# Altium integrated library 860010580021_Altium_WCAP-ATG8_rev20a.IntLib: 195 symbols (part 2 of 2)
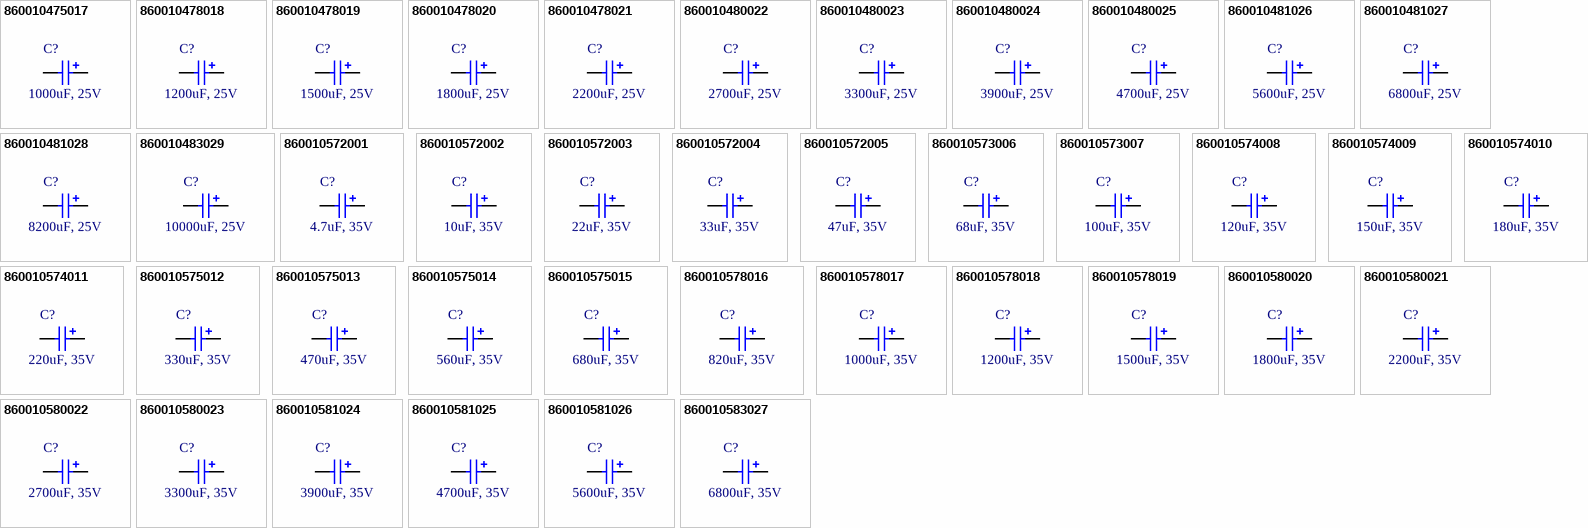
[diagram p5: symbols 860010475017 to 860010583027]

## 860010580022
designator C?, comment 2700uF, 35V
WCAP-ATG8 Aluminum Electrolytic Capacitor, Radial, THT, D16xH31.5mm, 2700uF, 35V; Manufacturer Part Number: 860010580022; Manufacturer: Wurth Elektronik; Dissipation Factor: 12%; Endurance: 2000h; Leakage Current: 945uA; Ripple Current: 2178mA; Capacitance Tolerance: +/-20%; Rated Voltage: 35VDC; Technical Reference: ATBK315272M035DSPADB000; ComponentLink1Description: Manufacturer; ComponentLink1URL: http://www.we-online.de; ComponentLink2Description: Datasheet; ComponentLink2URL: https://www.we-online.com/catalog/datasheet/860010580022.pdf; Height: 31.5mm; Mounting Technology: THT; Operating Temperature: -40 to +85degC; Packaging: Ammo Pack; Published Date: May 2020; Capacitance: 2700uF; Diameter: 16mm
footprint WCAP-ATG8_16x31.5
pins: 1 N, 2 P

## 860010580023
designator C?, comment 3300uF, 35V
WCAP-ATG8 Aluminum Electrolytic Capacitor, Radial, THT, D16xH31.5mm, 3300uF, 35V; Manufacturer Part Number: 860010580023; Manufacturer: Wurth Elektronik; Dissipation Factor: 12%; Endurance: 2000h; Leakage Current: 1155uA; Ripple Current: 2365mA; Capacitance Tolerance: +/-20%; Rated Voltage: 35VDC; Technical Reference: ATBK315332M035DSPADB000; ComponentLink1Description: Manufacturer; ComponentLink1URL: http://www.we-online.de; ComponentLink2Description: Datasheet; ComponentLink2URL: https://www.we-online.com/catalog/datasheet/860010580023.pdf; Height: 31.5mm; Mounting Technology: THT; Operating Temperature: -40 to +85degC; Packaging: Ammo Pack; Published Date: May 2020; Capacitance: 3300uF; Diameter: 16mm
footprint WCAP-ATG8_16x31.5
pins: 1 N, 2 P

## 860010581024
designator C?, comment 3900uF, 35V
WCAP-ATG8 Aluminum Electrolytic Capacitor, Radial, THT, D18xH31.5mm, 3900uF, 35V; Manufacturer Part Number: 860010581024; Manufacturer: Wurth Elektronik; Dissipation Factor: 12%; Endurance: 2000h; Leakage Current: 1365uA; Ripple Current: 2640mA; Capacitance Tolerance: +/-20%; Rated Voltage: 35VDC; Technical Reference: ATBL315392M035DSPAEB000; ComponentLink1Description: Manufacturer; ComponentLink1URL: http://www.we-online.de; ComponentLink2Description: Datasheet; ComponentLink2URL: https://www.we-online.com/catalog/datasheet/860010581024.pdf; Height: 31.5mm; Mounting Technology: THT; Operating Temperature: -40 to +85degC; Packaging: Ammo Pack; Published Date: May 2020; Capacitance: 3900uF; Diameter: 18mm
footprint WCAP-ATG8_18x31.5
pins: 1 N, 2 P

## 860010581025
designator C?, comment 4700uF, 35V
WCAP-ATG8 Aluminum Electrolytic Capacitor, Radial, THT, D18xH35.5mm, 4700uF, 35V; Manufacturer Part Number: 860010581025; Manufacturer: Wurth Elektronik; Dissipation Factor: 12%; Endurance: 2000h; Leakage Current: 1645uA; Ripple Current: 2860mA; Capacitance Tolerance: +/-20%; Rated Voltage: 35VDC; Technical Reference: ATBL355472M035DSPAEB000; ComponentLink1Description: Manufacturer; ComponentLink1URL: http://www.we-online.de; ComponentLink2Description: Datasheet; ComponentLink2URL: https://www.we-online.com/catalog/datasheet/860010581025.pdf; Height: 35.5mm; Mounting Technology: THT; Operating Temperature: -40 to +85degC; Packaging: Ammo Pack; Published Date: May 2020; Capacitance: 4700uF; Diameter: 18mm
footprint WCAP-ATG8_18x35.5
pins: 1 N, 2 P

## 860010581026
designator C?, comment 5600uF, 35V
WCAP-ATG8 Aluminum Electrolytic Capacitor, Radial, THT, D18xH41mm, 5600uF, 35V; Manufacturer Part Number: 860010581026; Manufacturer: Wurth Elektronik; Dissipation Factor: 12%; Endurance: 2000h; Leakage Current: 1960uA; Ripple Current: 2915mA; Capacitance Tolerance: +/-20%; Rated Voltage: 35VDC; Technical Reference: ATBL410562M035DSPS1B000; ComponentLink1Description: Manufacturer; ComponentLink1URL: http://www.we-online.de; ComponentLink2Description: Datasheet; ComponentLink2URL: https://www.we-online.com/catalog/datasheet/860010581026.pdf; Height: 41mm; Mounting Technology: THT; Operating Temperature: -40 to +85degC; Packaging: Ammo Pack; Published Date: May 2020; Capacitance: 5600uF; Diameter: 18mm
footprint WCAP-ATG8_18x41
pins: 1 N, 2 P

## 860010583027
designator C?, comment 6800uF, 35V
WCAP-ATG8 Aluminum Electrolytic Capacitor, Radial, THT, D22xH41mm, 6800uF, 35V; Manufacturer Part Number: 860010583027; Manufacturer: Wurth Elektronik; Dissipation Factor: 12%; Endurance: 2000h; Leakage Current: 2380uA; Ripple Current: 3630mA; Capacitance Tolerance: +/-20%; Rated Voltage: 35VDC; Technical Reference: ATBN410682M035DSPS2B000; ComponentLink1Description: Manufacturer; ComponentLink1URL: http://www.we-online.de; ComponentLink2Description: Datasheet; ComponentLink2URL: https://www.we-online.com/catalog/datasheet/860010583027.pdf; Height: 41mm; Mounting Technology: THT; Operating Temperature: -40 to +85degC; Packaging: Ammo Pack; Published Date: May 2020; Capacitance: 6800uF; Diameter: 22mm
footprint WCAP-ATG8_22x41
pins: 1 N, 2 P

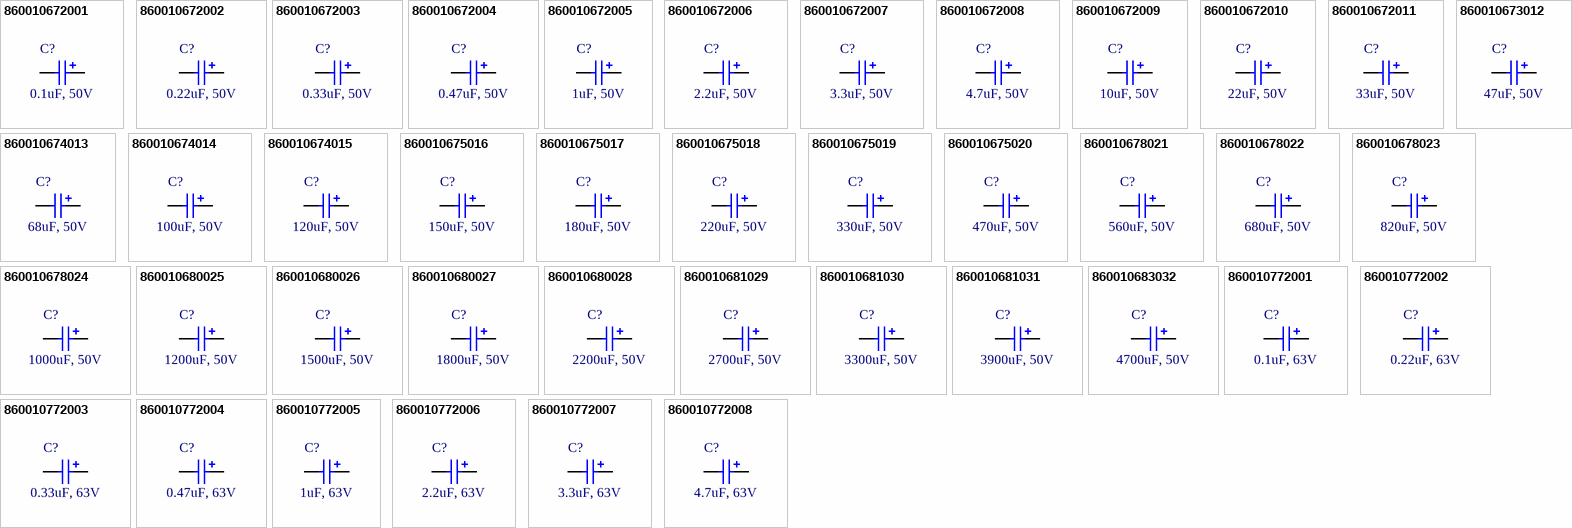
[diagram p3: symbols 860010672001 to 860010772008]

## 860010672001
designator C?, comment 0.1uF, 50V
WCAP-ATG8 Aluminum Electrolytic Capacitor, Radial, THT, D5xH11mm, 0.1uF, 50V; Manufacturer Part Number: 860010672001; Manufacturer: Wurth Elektronik; Dissipation Factor: 10%; Endurance: 2000h; Leakage Current: 3uA; Ripple Current: 3.3mA; Capacitance Tolerance: +/-20%; Rated Voltage: 50VDC; Technical Reference: ATBC110R10M050DSPA3B000; ComponentLink1Description: Manufacturer; ComponentLink1URL: http://www.we-online.de; ComponentLink2Description: Datasheet; ComponentLink2URL: https://www.we-online.com/catalog/datasheet/860010672001.pdf; Height: 11mm; Mounting Technology: THT; Operating Temperature: -40 to +85degC; Packaging: Ammo Pack; Published Date: May 2020; Capacitance: 0.1uF; Diameter: 5mm
footprint WCAP-ATG8_5x11
pins: 1 N, 2 P

## 860010672002
designator C?, comment 0.22uF, 50V
WCAP-ATG8 Aluminum Electrolytic Capacitor, Radial, THT, D5xH11mm, 0.22uF, 50V; Manufacturer Part Number: 860010672002; Manufacturer: Wurth Elektronik; Dissipation Factor: 10%; Endurance: 2000h; Leakage Current: 3uA; Ripple Current: 3.3mA; Capacitance Tolerance: +/-20%; Rated Voltage: 50VDC; Technical Reference: ATBC110R22M050DSPA3B000; ComponentLink1Description: Manufacturer; ComponentLink1URL: http://www.we-online.de; ComponentLink2Description: Datasheet; ComponentLink2URL: https://www.we-online.com/catalog/datasheet/860010672002.pdf; Height: 11mm; Mounting Technology: THT; Operating Temperature: -40 to +85degC; Packaging: Ammo Pack; Published Date: May 2020; Capacitance: 0.22uF; Diameter: 5mm
footprint WCAP-ATG8_5x11
pins: 1 N, 2 P

## 860010672003
designator C?, comment 0.33uF, 50V
WCAP-ATG8 Aluminum Electrolytic Capacitor, Radial, THT, D5xH11mm, 0.33uF, 50V; Manufacturer Part Number: 860010672003; Manufacturer: Wurth Elektronik; Dissipation Factor: 10%; Endurance: 2000h; Leakage Current: 3uA; Ripple Current: 5.5mA; Capacitance Tolerance: +/-20%; Rated Voltage: 50VDC; Technical Reference: ATBC110R33M050DSPA3B000; ComponentLink1Description: Manufacturer; ComponentLink1URL: http://www.we-online.de; ComponentLink2Description: Datasheet; ComponentLink2URL: https://www.we-online.com/catalog/datasheet/860010672003.pdf; Height: 11mm; Mounting Technology: THT; Operating Temperature: -40 to +85degC; Packaging: Ammo Pack; Published Date: May 2020; Capacitance: 0.33uF; Diameter: 5mm
footprint WCAP-ATG8_5x11
pins: 1 N, 2 P

## 860010672004
designator C?, comment 0.47uF, 50V
WCAP-ATG8 Aluminum Electrolytic Capacitor, Radial, THT, D5xH11mm, 0.47uF, 50V; Manufacturer Part Number: 860010672004; Manufacturer: Wurth Elektronik; Dissipation Factor: 10%; Endurance: 2000h; Leakage Current: 3uA; Ripple Current: 7.5mA; Capacitance Tolerance: +/-20%; Rated Voltage: 50VDC; Technical Reference: ATBC110R47M050DSPA3B000; ComponentLink1Description: Manufacturer; ComponentLink1URL: http://www.we-online.de; ComponentLink2Description: Datasheet; ComponentLink2URL: https://www.we-online.com/catalog/datasheet/860010672004.pdf; Height: 11mm; Mounting Technology: THT; Operating Temperature: -40 to +85degC; Packaging: Ammo Pack; Published Date: May 2020; Capacitance: 0.47uF; Diameter: 5mm
footprint WCAP-ATG8_5x11
pins: 1 N, 2 P

## 860010672005
designator C?, comment 1uF, 50V
WCAP-ATG8 Aluminum Electrolytic Capacitor, Radial, THT, D5xH11mm, 1uF, 50V; Manufacturer Part Number: 860010672005; Manufacturer: Wurth Elektronik; Dissipation Factor: 10%; Endurance: 2000h; Leakage Current: 3uA; Ripple Current: 17mA; Capacitance Tolerance: +/-20%; Rated Voltage: 50VDC; Technical Reference: ATBC110010M050DSPA3B000; ComponentLink1Description: Manufacturer; ComponentLink1URL: http://www.we-online.de; ComponentLink2Description: Datasheet; ComponentLink2URL: https://www.we-online.com/catalog/datasheet/860010672005.pdf; Height: 11mm; Mounting Technology: THT; Operating Temperature: -40 to +85degC; Packaging: Ammo Pack; Published Date: May 2020; Capacitance: 1uF; Diameter: 5mm
footprint WCAP-ATG8_5x11
pins: 1 N, 2 P

## 860010672006
designator C?, comment 2.2uF, 50V
WCAP-ATG8 Aluminum Electrolytic Capacitor, Radial, THT, D5xH11mm, 2.2uF, 50V; Manufacturer Part Number: 860010672006; Manufacturer: Wurth Elektronik; Dissipation Factor: 10%; Endurance: 2000h; Leakage Current: 3uA; Ripple Current: 28mA; Capacitance Tolerance: +/-20%; Rated Voltage: 50VDC; Technical Reference: ATBC1102R2M050DSPA3B000; ComponentLink1Description: Manufacturer; ComponentLink1URL: http://www.we-online.de; ComponentLink2Description: Datasheet; ComponentLink2URL: https://www.we-online.com/catalog/datasheet/860010672006.pdf; Height: 11mm; Mounting Technology: THT; Operating Temperature: -40 to +85degC; Packaging: Ammo Pack; Published Date: May 2020; Capacitance: 2.2uF; Diameter: 5mm
footprint WCAP-ATG8_5x11
pins: 1 N, 2 P

## 860010672007
designator C?, comment 3.3uF, 50V
WCAP-ATG8 Aluminum Electrolytic Capacitor, Radial, THT, D5xH11mm, 3.3uF, 50V; Manufacturer Part Number: 860010672007; Manufacturer: Wurth Elektronik; Dissipation Factor: 10%; Endurance: 2000h; Leakage Current: 3uA; Ripple Current: 39mA; Capacitance Tolerance: +/-20%; Rated Voltage: 50VDC; Technical Reference: ATBC1103R3M050DSPA3B000; ComponentLink1Description: Manufacturer; ComponentLink1URL: http://www.we-online.de; ComponentLink2Description: Datasheet; ComponentLink2URL: https://www.we-online.com/catalog/datasheet/860010672007.pdf; Height: 11mm; Mounting Technology: THT; Operating Temperature: -40 to +85degC; Packaging: Ammo Pack; Published Date: May 2020; Capacitance: 3.3uF; Diameter: 5mm
footprint WCAP-ATG8_5x11
pins: 1 N, 2 P

## 860010672008
designator C?, comment 4.7uF, 50V
WCAP-ATG8 Aluminum Electrolytic Capacitor, Radial, THT, D5xH11mm, 4.7uF, 50V; Manufacturer Part Number: 860010672008; Manufacturer: Wurth Elektronik; Dissipation Factor: 10%; Endurance: 2000h; Leakage Current: 3uA; Ripple Current: 46mA; Capacitance Tolerance: +/-20%; Rated Voltage: 50VDC; Technical Reference: ATBC1104R7M050DSPA3B000; ComponentLink1Description: Manufacturer; ComponentLink1URL: http://www.we-online.de; ComponentLink2Description: Datasheet; ComponentLink2URL: https://www.we-online.com/catalog/datasheet/860010672008.pdf; Height: 11mm; Mounting Technology: THT; Operating Temperature: -40 to +85degC; Packaging: Ammo Pack; Published Date: May 2020; Capacitance: 4.7uF; Diameter: 5mm
footprint WCAP-ATG8_5x11
pins: 1 N, 2 P

## 860010672009
designator C?, comment 10uF, 50V
WCAP-ATG8 Aluminum Electrolytic Capacitor, Radial, THT, D5xH11mm, 10uF, 50V; Manufacturer Part Number: 860010672009; Manufacturer: Wurth Elektronik; Dissipation Factor: 10%; Endurance: 2000h; Leakage Current: 5uA; Ripple Current: 72mA; Capacitance Tolerance: +/-20%; Rated Voltage: 50VDC; Technical Reference: ATBC110100M050DSPA3B000; ComponentLink1Description: Manufacturer; ComponentLink1URL: http://www.we-online.de; ComponentLink2Description: Datasheet; ComponentLink2URL: https://www.we-online.com/catalog/datasheet/860010672009.pdf; Height: 11mm; Mounting Technology: THT; Operating Temperature: -40 to +85degC; Packaging: Ammo Pack; Published Date: May 2020; Capacitance: 10uF; Diameter: 5mm
footprint WCAP-ATG8_5x11
pins: 1 N, 2 P

## 860010672010
designator C?, comment 22uF, 50V
WCAP-ATG8 Aluminum Electrolytic Capacitor, Radial, THT, D5xH11mm, 22uF, 50V; Manufacturer Part Number: 860010672010; Manufacturer: Wurth Elektronik; Dissipation Factor: 10%; Endurance: 2000h; Leakage Current: 11uA; Ripple Current: 110mA; Capacitance Tolerance: +/-20%; Rated Voltage: 50VDC; Technical Reference: ATBC110220M050DSPA3B000; ComponentLink1Description: Manufacturer; ComponentLink1URL: http://www.we-online.de; ComponentLink2Description: Datasheet; ComponentLink2URL: https://www.we-online.com/catalog/datasheet/860010672010.pdf; Height: 11mm; Mounting Technology: THT; Operating Temperature: -40 to +85degC; Packaging: Ammo Pack; Published Date: May 2020; Capacitance: 22uF; Diameter: 5mm
footprint WCAP-ATG8_5x11
pins: 1 N, 2 P

## 860010672011
designator C?, comment 33uF, 50V
WCAP-ATG8 Aluminum Electrolytic Capacitor, Radial, THT, D5xH11mm, 33uF, 50V; Manufacturer Part Number: 860010672011; Manufacturer: Wurth Elektronik; Dissipation Factor: 10%; Endurance: 2000h; Leakage Current: 16.5uA; Ripple Current: 132mA; Capacitance Tolerance: +/-20%; Rated Voltage: 50VDC; Technical Reference: ATBC110330M050DSPA3B000; ComponentLink1Description: Manufacturer; ComponentLink1URL: http://www.we-online.de; ComponentLink2Description: Datasheet; ComponentLink2URL: https://www.we-online.com/catalog/datasheet/860010672011.pdf; Height: 11mm; Mounting Technology: THT; Operating Temperature: -40 to +85degC; Packaging: Ammo Pack; Published Date: May 2020; Capacitance: 33uF; Diameter: 5mm
footprint WCAP-ATG8_5x11
pins: 1 N, 2 P

## 860010673012
designator C?, comment 47uF, 50V
WCAP-ATG8 Aluminum Electrolytic Capacitor, Radial, THT, D6.3xH11mm, 47uF, 50V; Manufacturer Part Number: 860010673012; Manufacturer: Wurth Elektronik; Dissipation Factor: 10%; Endurance: 2000h; Leakage Current: 23.5uA; Ripple Current: 165mA; Capacitance Tolerance: +/-20%; Rated Voltage: 50VDC; Technical Reference: ATBD110470M050DSPA4B000; ComponentLink1Description: Manufacturer; ComponentLink1URL: http://www.we-online.de; ComponentLink2Description: Datasheet; ComponentLink2URL: https://www.we-online.com/catalog/datasheet/860010673012.pdf; Height: 11mm; Mounting Technology: THT; Operating Temperature: -40 to +85degC; Packaging: Ammo Pack; Published Date: May 2020; Capacitance: 47uF; Diameter: 6.3mm
footprint WCAP-ATG8_6.3x11
pins: 1 N, 2 P

## 860010674013
designator C?, comment 68uF, 50V
WCAP-ATG8 Aluminum Electrolytic Capacitor, Radial, THT, D8xH11.5mm, 68uF, 50V; Manufacturer Part Number: 860010674013; Manufacturer: Wurth Elektronik; Dissipation Factor: 10%; Endurance: 2000h; Leakage Current: 34uA; Ripple Current: 220mA; Capacitance Tolerance: +/-20%; Rated Voltage: 50VDC; Technical Reference: ATBE115680M050DSPA7B000; ComponentLink1Description: Manufacturer; ComponentLink1URL: http://www.we-online.de; ComponentLink2Description: Datasheet; ComponentLink2URL: https://www.we-online.com/catalog/datasheet/860010674013.pdf; Height: 11.5mm; Mounting Technology: THT; Operating Temperature: -40 to +85degC; Packaging: Ammo Pack; Published Date: May 2020; Capacitance: 68uF; Diameter: 8mm
footprint WCAP-ATG8_8x11.5
pins: 1 N, 2 P

## 860010674014
designator C?, comment 100uF, 50V
WCAP-ATG8 Aluminum Electrolytic Capacitor, Radial, THT, D8xH11.5mm, 100uF, 50V; Manufacturer Part Number: 860010674014; Manufacturer: Wurth Elektronik; Dissipation Factor: 10%; Endurance: 2000h; Leakage Current: 50uA; Ripple Current: 286mA; Capacitance Tolerance: +/-20%; Rated Voltage: 50VDC; Technical Reference: ATBE115101M050DSPA7B000; ComponentLink1Description: Manufacturer; ComponentLink1URL: http://www.we-online.de; ComponentLink2Description: Datasheet; ComponentLink2URL: https://www.we-online.com/catalog/datasheet/860010674014.pdf; Height: 11.5mm; Mounting Technology: THT; Operating Temperature: -40 to +85degC; Packaging: Ammo Pack; Published Date: May 2020; Capacitance: 100uF; Diameter: 8mm
footprint WCAP-ATG8_8x11.5
pins: 1 N, 2 P

## 860010674015
designator C?, comment 120uF, 50V
WCAP-ATG8 Aluminum Electrolytic Capacitor, Radial, THT, D8xH11.5mm, 120uF, 50V; Manufacturer Part Number: 860010674015; Manufacturer: Wurth Elektronik; Dissipation Factor: 10%; Endurance: 2000h; Leakage Current: 60uA; Ripple Current: 319mA; Capacitance Tolerance: +/-20%; Rated Voltage: 50VDC; Technical Reference: ATBE115121M050DSPA7B000; ComponentLink1Description: Manufacturer; ComponentLink1URL: http://www.we-online.de; ComponentLink2Description: Datasheet; ComponentLink2URL: https://www.we-online.com/catalog/datasheet/860010674015.pdf; Height: 11.5mm; Mounting Technology: THT; Operating Temperature: -40 to +85degC; Packaging: Ammo Pack; Published Date: May 2020; Capacitance: 120uF; Diameter: 8mm
footprint WCAP-ATG8_8x11.5
pins: 1 N, 2 P

## 860010675016
designator C?, comment 150uF, 50V
WCAP-ATG8 Aluminum Electrolytic Capacitor, Radial, THT, D10xH12.5mm, 150uF, 50V; Manufacturer Part Number: 860010675016; Manufacturer: Wurth Elektronik; Dissipation Factor: 10%; Endurance: 2000h; Leakage Current: 75uA; Ripple Current: 363mA; Capacitance Tolerance: +/-20%; Rated Voltage: 50VDC; Technical Reference: ATBF125151M050DSPA9B000; ComponentLink1Description: Manufacturer; ComponentLink1URL: http://www.we-online.de; ComponentLink2Description: Datasheet; ComponentLink2URL: https://www.we-online.com/catalog/datasheet/860010675016.pdf; Height: 12.5mm; Mounting Technology: THT; Operating Temperature: -40 to +85degC; Packaging: Ammo Pack; Published Date: May 2020; Capacitance: 150uF; Diameter: 10mm
footprint WCAP-ATG8_10x12.5
pins: 1 N, 2 P

## 860010675017
designator C?, comment 180uF, 50V
WCAP-ATG8 Aluminum Electrolytic Capacitor, Radial, THT, D10xH12.5mm, 180uF, 50V; Manufacturer Part Number: 860010675017; Manufacturer: Wurth Elektronik; Dissipation Factor: 10%; Endurance: 2000h; Leakage Current: 90uA; Ripple Current: 418mA; Capacitance Tolerance: +/-20%; Rated Voltage: 50VDC; Technical Reference: ATBF125181M050DSPA9B000; ComponentLink1Description: Manufacturer; ComponentLink1URL: http://www.we-online.de; ComponentLink2Description: Datasheet; ComponentLink2URL: https://www.we-online.com/catalog/datasheet/860010675017.pdf; Height: 12.5mm; Mounting Technology: THT; Operating Temperature: -40 to +85degC; Packaging: Ammo Pack; Published Date: May 2020; Capacitance: 180uF; Diameter: 10mm
footprint WCAP-ATG8_10x12.5
pins: 1 N, 2 P

## 860010675018
designator C?, comment 220uF, 50V
WCAP-ATG8 Aluminum Electrolytic Capacitor, Radial, THT, D10xH12.5mm, 220uF, 50V; Manufacturer Part Number: 860010675018; Manufacturer: Wurth Elektronik; Dissipation Factor: 10%; Endurance: 2000h; Leakage Current: 110uA; Ripple Current: 468mA; Capacitance Tolerance: +/-20%; Rated Voltage: 50VDC; Technical Reference: ATBF125221M050DSPA9B000; ComponentLink1Description: Manufacturer; ComponentLink1URL: http://www.we-online.de; ComponentLink2Description: Datasheet; ComponentLink2URL: https://www.we-online.com/catalog/datasheet/860010675018.pdf; Height: 12.5mm; Mounting Technology: THT; Operating Temperature: -40 to +85degC; Packaging: Ammo Pack; Published Date: May 2020; Capacitance: 220uF; Diameter: 10mm
footprint WCAP-ATG8_10x12.5
pins: 1 N, 2 P

## 860010675019
designator C?, comment 330uF, 50V
WCAP-ATG8 Aluminum Electrolytic Capacitor, Radial, THT, D10xH16mm, 330uF, 50V; Manufacturer Part Number: 860010675019; Manufacturer: Wurth Elektronik; Dissipation Factor: 10%; Endurance: 2000h; Leakage Current: 165uA; Ripple Current: 649mA; Capacitance Tolerance: +/-20%; Rated Voltage: 50VDC; Technical Reference: ATBF160331M050DSPAAB000; ComponentLink1Description: Manufacturer; ComponentLink1URL: http://www.we-online.de; ComponentLink2Description: Datasheet; ComponentLink2URL: https://www.we-online.com/catalog/datasheet/860010675019.pdf; Height: 16mm; Mounting Technology: THT; Operating Temperature: -40 to +85degC; Packaging: Ammo Pack; Published Date: May 2020; Capacitance: 330uF; Diameter: 10mm
footprint WCAP-ATG8_10x16
pins: 1 N, 2 P

## 860010675020
designator C?, comment 470uF, 50V
WCAP-ATG8 Aluminum Electrolytic Capacitor, Radial, THT, D10xH20mm, 470uF, 50V; Manufacturer Part Number: 860010675020; Manufacturer: Wurth Elektronik; Dissipation Factor: 10%; Endurance: 2000h; Leakage Current: 235uA; Ripple Current: 828mA; Capacitance Tolerance: +/-20%; Rated Voltage: 50VDC; Technical Reference: ATBF200471M050DSPAAB000; ComponentLink1Description: Manufacturer; ComponentLink1URL: http://www.we-online.de; ComponentLink2Description: Datasheet; ComponentLink2URL: https://www.we-online.com/catalog/datasheet/860010675020.pdf; Height: 20mm; Mounting Technology: THT; Operating Temperature: -40 to +85degC; Packaging: Ammo Pack; Published Date: May 2020; Capacitance: 470uF; Diameter: 10mm
footprint WCAP-ATG8_10x20
pins: 1 N, 2 P

## 860010678021
designator C?, comment 560uF, 50V
WCAP-ATG8 Aluminum Electrolytic Capacitor, Radial, THT, D13xH20mm, 560uF, 50V; Manufacturer Part Number: 860010678021; Manufacturer: Wurth Elektronik; Dissipation Factor: 10%; Endurance: 2000h; Leakage Current: 280uA; Ripple Current: 902mA; Capacitance Tolerance: +/-20%; Rated Voltage: 50VDC; Technical Reference: ATBI200561M050DSPACB000; ComponentLink1Description: Manufacturer; ComponentLink1URL: http://www.we-online.de; ComponentLink2Description: Datasheet; ComponentLink2URL: https://www.we-online.com/catalog/datasheet/860010678021.pdf; Height: 20mm; Mounting Technology: THT; Operating Temperature: -40 to +85degC; Packaging: Ammo Pack; Published Date: May 2020; Capacitance: 560uF; Diameter: 13mm
footprint WCAP-ATG8_13x20
pins: 1 N, 2 P

## 860010678022
designator C?, comment 680uF, 50V
WCAP-ATG8 Aluminum Electrolytic Capacitor, Radial, THT, D13xH20mm, 680uF, 50V; Manufacturer Part Number: 860010678022; Manufacturer: Wurth Elektronik; Dissipation Factor: 10%; Endurance: 2000h; Leakage Current: 340uA; Ripple Current: 1056mA; Capacitance Tolerance: +/-20%; Rated Voltage: 50VDC; Technical Reference: ATBI200681M050DSPACB000; ComponentLink1Description: Manufacturer; ComponentLink1URL: http://www.we-online.de; ComponentLink2Description: Datasheet; ComponentLink2URL: https://www.we-online.com/catalog/datasheet/860010678022.pdf; Height: 20mm; Mounting Technology: THT; Operating Temperature: -40 to +85degC; Packaging: Ammo Pack; Published Date: May 2020; Capacitance: 680uF; Diameter: 13mm
footprint WCAP-ATG8_13x20
pins: 1 N, 2 P

## 860010678023
designator C?, comment 820uF, 50V
WCAP-ATG8 Aluminum Electrolytic Capacitor, Radial, THT, D13xH25mm, 820uF, 50V; Manufacturer Part Number: 860010678023; Manufacturer: Wurth Elektronik; Dissipation Factor: 10%; Endurance: 2000h; Leakage Current: 410uA; Ripple Current: 1287mA; Capacitance Tolerance: +/-20%; Rated Voltage: 50VDC; Technical Reference: ATBI250821M050DSPACB000; ComponentLink1Description: Manufacturer; ComponentLink1URL: http://www.we-online.de; ComponentLink2Description: Datasheet; ComponentLink2URL: https://www.we-online.com/catalog/datasheet/860010678023.pdf; Height: 25mm; Mounting Technology: THT; Operating Temperature: -40 to +85degC; Packaging: Ammo Pack; Published Date: May 2020; Capacitance: 820uF; Diameter: 13mm
footprint WCAP-ATG8_13x25
pins: 1 N, 2 P

## 860010678024
designator C?, comment 1000uF, 50V
WCAP-ATG8 Aluminum Electrolytic Capacitor, Radial, THT, D13xH25mm, 1000uF, 50V; Manufacturer Part Number: 860010678024; Manufacturer: Wurth Elektronik; Dissipation Factor: 10%; Endurance: 2000h; Leakage Current: 500uA; Ripple Current: 1485mA; Capacitance Tolerance: +/-20%; Rated Voltage: 50VDC; Technical Reference: ATBI250102M050DSPACB000; ComponentLink1Description: Manufacturer; ComponentLink1URL: http://www.we-online.de; ComponentLink2Description: Datasheet; ComponentLink2URL: https://www.we-online.com/catalog/datasheet/860010678024.pdf; Height: 25mm; Mounting Technology: THT; Operating Temperature: -40 to +85degC; Packaging: Ammo Pack; Published Date: May 2020; Capacitance: 1000uF; Diameter: 13mm
footprint WCAP-ATG8_13x25
pins: 1 N, 2 P

## 860010680025
designator C?, comment 1200uF, 50V
WCAP-ATG8 Aluminum Electrolytic Capacitor, Radial, THT, D16xH25mm, 1200uF, 50V; Manufacturer Part Number: 860010680025; Manufacturer: Wurth Elektronik; Dissipation Factor: 10%; Endurance: 2000h; Leakage Current: 600uA; Ripple Current: 1617mA; Capacitance Tolerance: +/-20%; Rated Voltage: 50VDC; Technical Reference: ATBK250122M050DSPAEB000; ComponentLink1Description: Manufacturer; ComponentLink1URL: http://www.we-online.de; ComponentLink2Description: Datasheet; ComponentLink2URL: https://www.we-online.com/catalog/datasheet/860010680025.pdf; Height: 25mm; Mounting Technology: THT; Operating Temperature: -40 to +85degC; Packaging: Ammo Pack; Published Date: May 2020; Capacitance: 1200uF; Diameter: 16mm
footprint WCAP-ATG8_16x25
pins: 1 N, 2 P

## 860010680026
designator C?, comment 1500uF, 50V
WCAP-ATG8 Aluminum Electrolytic Capacitor, Radial, THT, D16xH31.5mm, 1500uF, 50V; Manufacturer Part Number: 860010680026; Manufacturer: Wurth Elektronik; Dissipation Factor: 10%; Endurance: 2000h; Leakage Current: 750uA; Ripple Current: 1848mA; Capacitance Tolerance: +/-20%; Rated Voltage: 50VDC; Technical Reference: ATBK315152M050DSPADB000; ComponentLink1Description: Manufacturer; ComponentLink1URL: http://www.we-online.de; ComponentLink2Description: Datasheet; ComponentLink2URL: https://www.we-online.com/catalog/datasheet/860010680026.pdf; Height: 31.5mm; Mounting Technology: THT; Operating Temperature: -40 to +85degC; Packaging: Ammo Pack; Published Date: May 2020; Capacitance: 1500uF; Diameter: 16mm
footprint WCAP-ATG8_16x31.5
pins: 1 N, 2 P

## 860010680027
designator C?, comment 1800uF, 50V
WCAP-ATG8 Aluminum Electrolytic Capacitor, Radial, THT, D16xH31.5mm, 1800uF, 50V; Manufacturer Part Number: 860010680027; Manufacturer: Wurth Elektronik; Dissipation Factor: 10%; Endurance: 2000h; Leakage Current: 900uA; Ripple Current: 2112mA; Capacitance Tolerance: +/-20%; Rated Voltage: 50VDC; Technical Reference: ATBK315182M050DSPADB000; ComponentLink1Description: Manufacturer; ComponentLink1URL: http://www.we-online.de; ComponentLink2Description: Datasheet; ComponentLink2URL: https://www.we-online.com/catalog/datasheet/860010680027.pdf; Height: 31.5mm; Mounting Technology: THT; Operating Temperature: -40 to +85degC; Packaging: Ammo Pack; Published Date: May 2020; Capacitance: 1800uF; Diameter: 16mm
footprint WCAP-ATG8_16x31.5
pins: 1 N, 2 P

## 860010680028
designator C?, comment 2200uF, 50V
WCAP-ATG8 Aluminum Electrolytic Capacitor, Radial, THT, D16xH35.5mm, 2200uF, 50V; Manufacturer Part Number: 860010680028; Manufacturer: Wurth Elektronik; Dissipation Factor: 10%; Endurance: 2000h; Leakage Current: 1100uA; Ripple Current: 2310mA; Capacitance Tolerance: +/-20%; Rated Voltage: 50VDC; Technical Reference: ATBK355222M050DSPADB000; ComponentLink1Description: Manufacturer; ComponentLink1URL: http://www.we-online.de; ComponentLink2Description: Datasheet; ComponentLink2URL: https://www.we-online.com/catalog/datasheet/860010680028.pdf; Height: 35.5mm; Mounting Technology: THT; Operating Temperature: -40 to +85degC; Packaging: Ammo Pack; Published Date: May 2020; Capacitance: 2200uF; Diameter: 16mm
footprint WCAP-ATG8_16x35.5
pins: 1 N, 2 P

## 860010681029
designator C?, comment 2700uF, 50V
WCAP-ATG8 Aluminum Electrolytic Capacitor, Radial, THT, D18xH31.5mm, 2700uF, 50V; Manufacturer Part Number: 860010681029; Manufacturer: Wurth Elektronik; Dissipation Factor: 10%; Endurance: 2000h; Leakage Current: 1350uA; Ripple Current: 2420mA; Capacitance Tolerance: +/-20%; Rated Voltage: 50VDC; Technical Reference: ATBL315272M050DSPAEB000; ComponentLink1Description: Manufacturer; ComponentLink1URL: http://www.we-online.de; ComponentLink2Description: Datasheet; ComponentLink2URL: https://www.we-online.com/catalog/datasheet/860010681029.pdf; Height: 31.5mm; Mounting Technology: THT; Operating Temperature: -40 to +85degC; Packaging: Ammo Pack; Published Date: May 2020; Capacitance: 2700uF; Diameter: 18mm
footprint WCAP-ATG8_18x31.5
pins: 1 N, 2 P

## 860010681030
designator C?, comment 3300uF, 50V
WCAP-ATG8 Aluminum Electrolytic Capacitor, Radial, THT, D18xH35.5mm, 3300uF, 50V; Manufacturer Part Number: 860010681030; Manufacturer: Wurth Elektronik; Dissipation Factor: 10%; Endurance: 2000h; Leakage Current: 1650uA; Ripple Current: 2750mA; Capacitance Tolerance: +/-20%; Rated Voltage: 50VDC; Technical Reference: ATBL355332M050DSPAEB000; ComponentLink1Description: Manufacturer; ComponentLink1URL: http://www.we-online.de; ComponentLink2Description: Datasheet; ComponentLink2URL: https://www.we-online.com/catalog/datasheet/860010681030.pdf; Height: 35.5mm; Mounting Technology: THT; Operating Temperature: -40 to +85degC; Packaging: Ammo Pack; Published Date: May 2020; Capacitance: 3300uF; Diameter: 18mm
footprint WCAP-ATG8_18x35.5
pins: 1 N, 2 P

## 860010681031
designator C?, comment 3900uF, 50V
WCAP-ATG8 Aluminum Electrolytic Capacitor, Radial, THT, D18xH41mm, 3900uF, 50V; Manufacturer Part Number: 860010681031; Manufacturer: Wurth Elektronik; Dissipation Factor: 10%; Endurance: 2000h; Leakage Current: 1950uA; Ripple Current: 2871mA; Capacitance Tolerance: +/-20%; Rated Voltage: 50VDC; Technical Reference: ATBL410392M050DSPS1B000; ComponentLink1Description: Manufacturer; ComponentLink1URL: http://www.we-online.de; ComponentLink2Description: Datasheet; ComponentLink2URL: https://www.we-online.com/catalog/datasheet/860010681031.pdf; Height: 41mm; Mounting Technology: THT; Operating Temperature: -40 to +85degC; Packaging: Ammo Pack; Published Date: May 2020; Capacitance: 3900uF; Diameter: 18mm
footprint WCAP-ATG8_18x41
pins: 1 N, 2 P

## 860010683032
designator C?, comment 4700uF, 50V
WCAP-ATG8 Aluminum Electrolytic Capacitor, Radial, THT, D22xH41mm, 4700uF, 50V; Manufacturer Part Number: 860010683032; Manufacturer: Wurth Elektronik; Dissipation Factor: 10%; Endurance: 2000h; Leakage Current: 2350uA; Ripple Current: 3355mA; Capacitance Tolerance: +/-20%; Rated Voltage: 50VDC; Technical Reference: ATBN410472M050DSPS2B000; ComponentLink1Description: Manufacturer; ComponentLink1URL: http://www.we-online.de; ComponentLink2Description: Datasheet; ComponentLink2URL: https://www.we-online.com/catalog/datasheet/860010683032.pdf; Height: 41mm; Mounting Technology: THT; Operating Temperature: -40 to +85degC; Packaging: Ammo Pack; Published Date: May 2020; Capacitance: 4700uF; Diameter: 22mm
footprint WCAP-ATG8_22x41
pins: 1 N, 2 P

## 860010772001
designator C?, comment 0.1uF, 63V
WCAP-ATG8 Aluminum Electrolytic Capacitor, Radial, THT, D5xH11mm, 0.1uF, 63V; Manufacturer Part Number: 860010772001; Manufacturer: Wurth Elektronik; Dissipation Factor: 9%; Endurance: 2000h; Leakage Current: 3uA; Ripple Current: 4mA; Capacitance Tolerance: +/-20%; Rated Voltage: 63VDC; Technical Reference: ATBC110R10M063DSPA3B000; ComponentLink1Description: Manufacturer; ComponentLink1URL: http://www.we-online.de; ComponentLink2Description: Datasheet; ComponentLink2URL: https://www.we-online.com/catalog/datasheet/860010772001.pdf; Height: 11mm; Mounting Technology: THT; Operating Temperature: -40 to +85degC; Packaging: Ammo Pack; Published Date: May 2020; Capacitance: 0.1uF; Diameter: 5mm
footprint WCAP-ATG8_5x11
pins: 1 N, 2 P
